# Altium schematic symbol library Regulator_Switching.SchLib: 1120 symbols (part 6 of 8) (continued)
## TMR_1-4823SM
designator *  value TMR_1-4823SM  Reference: U
ki_keywords: Murata isolated isolation dc-dc converter transformer; ki_description: +/-33mA Regulated 1W DC/DC converter with 1.5kV isolation, 36V-75V input, +/-15V fixed Output Voltage, SMD; ki_fp_filters: Converter*DCDC*TRACO*TMR-1SM*SMD*; Footprint: Converter_DCDC:Converter_DCDC_TRACO_TMR-1SM_SMD; Datasheet: http://assets.tracopower.com/TMR1SM/documents/tmr1sm-datasheet.pdf
pins: 1 -VIN, 2 Remote_on/off, 6 Common hidden, 7 -VOUT, 8 +VOUT, 9 Common, 14 +VIN

## TNY263G
designator *  value TNY263G  Reference: U
ki_keywords: Enhanced, Energy Efficient, Low Power Off-line Switcher; ki_description: TinySwitch-II Family, 4.7W Output Power, SMD-8B; ki_fp_filters: PowerIntegrations?SMD?8B*; Footprint: Package_DIP:PowerIntegrations_SMD-8B; Datasheet: http://www.powerint.com/sites/default/files/product-docs/tny263_268.pdf
pins: 1 BP, 2 S, 3 S hidden, 4 EN/UV, 5 D, 7 S hidden, 8 S hidden

## TNY263P
designator *  value TNY263P  Reference: U
ki_keywords: Enhanced, Energy Efficient, Low Power Off-line Switcher; ki_description: TinySwitch-II Family, 4.7W Output Power, DIP-8B; ki_fp_filters: PowerIntegrations?PDIP?8B*; Footprint: Package_DIP:PowerIntegrations_PDIP-8B; Datasheet: http://www.powerint.com/sites/default/files/product-docs/tny263_268.pdf
pins: 1 BP, 2 S, 3 S hidden, 4 EN/UV, 5 D, 7 S hidden, 8 S hidden

## TNY264G
designator *  value TNY264G  Reference: U
ki_keywords: Enhanced, Energy Efficient, Low Power Off-line Switcher; ki_description: TinySwitch-II Family, 6W Output Power, SMD-8B; ki_fp_filters: PowerIntegrations?SMD?8B*; Footprint: Package_DIP:PowerIntegrations_SMD-8B; Datasheet: http://www.powerint.com/sites/default/files/product-docs/tny263_268.pdf
pins: 1 BP, 2 S, 3 S hidden, 4 EN/UV, 5 D, 7 S hidden, 8 S hidden

## TNY264P
designator *  value TNY264P  Reference: U
ki_keywords: Enhanced, Energy Efficient, Low Power Off-line Switcher; ki_description: TinySwitch-II Family, 6W Output Power, DIP-8B; ki_fp_filters: PowerIntegrations?PDIP?8B*; Footprint: Package_DIP:PowerIntegrations_PDIP-8B; Datasheet: http://www.powerint.com/sites/default/files/product-docs/tny263_268.pdf
pins: 1 BP, 2 S, 3 S hidden, 4 EN/UV, 5 D, 7 S hidden, 8 S hidden

## TNY265G
designator *  value TNY265G  Reference: U
ki_keywords: Enhanced, Energy Efficient, Low Power Off-line Switcher; ki_description: TinySwitch-II Family, 7.5W Output Power, SMD-8B; ki_fp_filters: PowerIntegrations?SMD?8B*; Footprint: Package_DIP:PowerIntegrations_SMD-8B; Datasheet: http://www.powerint.com/sites/default/files/product-docs/tny263_268.pdf
pins: 1 BP, 2 S, 3 S hidden, 4 EN/UV, 5 D, 7 S hidden, 8 S hidden

## TNY265P
designator *  value TNY265P  Reference: U
ki_keywords: Enhanced, Energy Efficient, Low Power Off-line Switcher; ki_description: TinySwitch-II Family, 7.5W Output Power, DIP-8B; ki_fp_filters: PowerIntegrations?PDIP?8B*; Footprint: Package_DIP:PowerIntegrations_PDIP-8B; Datasheet: http://www.powerint.com/sites/default/files/product-docs/tny263_268.pdf
pins: 1 BP, 2 S, 3 S hidden, 4 EN/UV, 5 D, 7 S hidden, 8 S hidden

## TNY266G
designator *  value TNY266G  Reference: U
ki_keywords: Enhanced, Energy Efficient, Low Power Off-line Switcher; ki_description: TinySwitch-II Family, 9.5W Output Power, SMD-8B; ki_fp_filters: PowerIntegrations?SMD?8B*; Footprint: Package_DIP:PowerIntegrations_SMD-8B; Datasheet: http://www.powerint.com/sites/default/files/product-docs/tny263_268.pdf
pins: 1 BP, 2 S, 3 S hidden, 4 EN/UV, 5 D, 7 S hidden, 8 S hidden

## TNY266P
designator *  value TNY266P  Reference: U
ki_keywords: Enhanced, Energy Efficient, Low Power Off-line Switcher; ki_description: TinySwitch-II Family, 9.5W Output Power, DIP-8B; ki_fp_filters: PowerIntegrations?PDIP?8B*; Footprint: Package_DIP:PowerIntegrations_PDIP-8B; Datasheet: http://www.powerint.com/sites/default/files/product-docs/tny263_268.pdf
pins: 1 BP, 2 S, 3 S hidden, 4 EN/UV, 5 D, 7 S hidden, 8 S hidden

## TNY267G
designator *  value TNY267G  Reference: U
ki_keywords: Enhanced, Energy Efficient, Low Power Off-line Switcher; ki_description: TinySwitch-II Family, 12W Output Power, SMD-8B; ki_fp_filters: PowerIntegrations?SMD?8B*; Footprint: Package_DIP:PowerIntegrations_SMD-8B; Datasheet: http://www.powerint.com/sites/default/files/product-docs/tny263_268.pdf
pins: 1 BP, 2 S, 3 S hidden, 4 EN/UV, 5 D, 7 S hidden, 8 S hidden

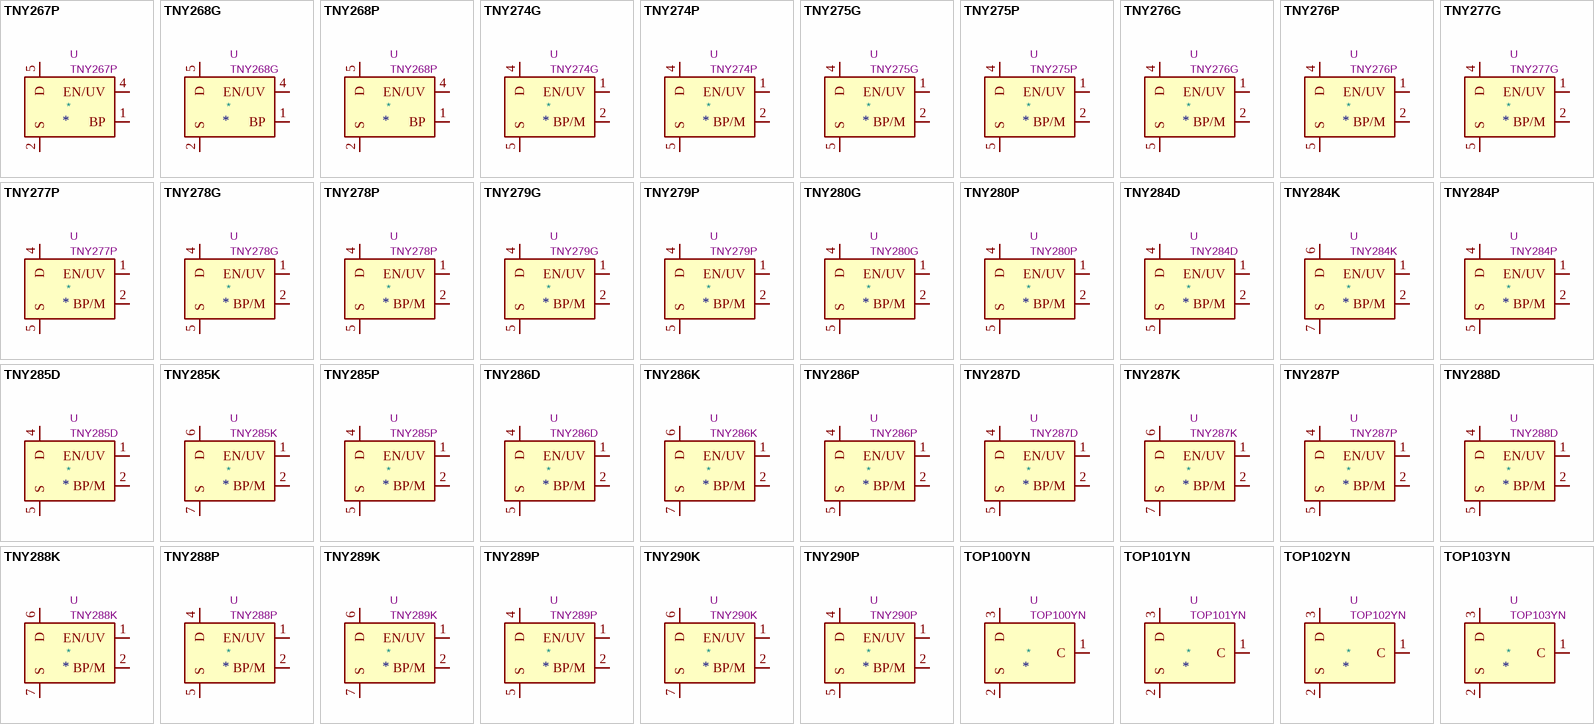
[diagram p21: symbols TNY267P to TOP103YN]

## TNY267P
designator *  value TNY267P  Reference: U
ki_keywords: Enhanced, Energy Efficient, Low Power Off-line Switcher; ki_description: TinySwitch-II Family, 12W Output Power, DIP-8B; ki_fp_filters: PowerIntegrations?PDIP?8B*; Footprint: Package_DIP:PowerIntegrations_PDIP-8B; Datasheet: http://www.powerint.com/sites/default/files/product-docs/tny263_268.pdf
pins: 1 BP, 2 S, 3 S hidden, 4 EN/UV, 5 D, 7 S hidden, 8 S hidden

## TNY268G
designator *  value TNY268G  Reference: U
ki_keywords: Enhanced, Energy Efficient, Low Power Off-line Switcher; ki_description: TinySwitch-II Family, 15W Output Power, SMD-8B; ki_fp_filters: PowerIntegrations?SMD?8B*; Footprint: Package_DIP:PowerIntegrations_SMD-8B; Datasheet: http://www.powerint.com/sites/default/files/product-docs/tny263_268.pdf
pins: 1 BP, 2 S, 3 S hidden, 4 EN/UV, 5 D, 7 S hidden, 8 S hidden

## TNY268P
designator *  value TNY268P  Reference: U
ki_keywords: Enhanced, Energy Efficient, Low Power Off-line Switcher; ki_description: TinySwitch-II Family, 15W Output Power, DIP-8B; ki_fp_filters: PowerIntegrations?PDIP?8B*; Footprint: Package_DIP:PowerIntegrations_PDIP-8B; Datasheet: http://www.powerint.com/sites/default/files/product-docs/tny263_268.pdf
pins: 1 BP, 2 S, 3 S hidden, 4 EN/UV, 5 D, 7 S hidden, 8 S hidden

## TNY274G
designator *  value TNY274G  Reference: U
ki_keywords: Energy-Efficient, Off-Line Switcher With Enhanced Flexibility and Extended Power Range; ki_description: TinySwitch-III Family, 8.5W Output Power, SMD-8C; ki_fp_filters: PowerIntegrations?SMD?8C*; Footprint: Package_DIP:PowerIntegrations_SMD-8C; Datasheet: http://www.powerint.com/sites/default/files/product-docs/tny274-280.pdf
pins: 1 EN/UV, 2 BP/M, 4 D, 5 S, 6 S hidden, 7 S hidden, 8 S hidden

## TNY274P
designator *  value TNY274P  Reference: U
ki_keywords: Energy-Efficient, Off-Line Switcher With Enhanced Flexibility and Extended Power Range; ki_description: TinySwitch-III Family, 8.5W Output Power, DIP-8C; ki_fp_filters: PowerIntegrations?PDIP?8C*; Footprint: Package_DIP:PowerIntegrations_PDIP-8C; Datasheet: http://www.powerint.com/sites/default/files/product-docs/tny274-280.pdf
pins: 1 EN/UV, 2 BP/M, 4 D, 5 S, 6 S hidden, 7 S hidden, 8 S hidden

## TNY275G
designator *  value TNY275G  Reference: U
ki_keywords: Energy-Efficient, Off-Line Switcher With Enhanced Flexibility and Extended Power Range; ki_description: TinySwitch-III Family, 11.5W Output Power, SMD-8C; ki_fp_filters: PowerIntegrations?SMD?8C*; Footprint: Package_DIP:PowerIntegrations_SMD-8C; Datasheet: http://www.powerint.com/sites/default/files/product-docs/tny274-280.pdf
pins: 1 EN/UV, 2 BP/M, 4 D, 5 S, 6 S hidden, 7 S hidden, 8 S hidden

## TNY275P
designator *  value TNY275P  Reference: U
ki_keywords: Energy-Efficient, Off-Line Switcher With Enhanced Flexibility and Extended Power Range; ki_description: TinySwitch-III Family, 11.5W Output Power, DIP-8C; ki_fp_filters: PowerIntegrations?PDIP?8C*; Footprint: Package_DIP:PowerIntegrations_PDIP-8C; Datasheet: http://www.powerint.com/sites/default/files/product-docs/tny274-280.pdf
pins: 1 EN/UV, 2 BP/M, 4 D, 5 S, 6 S hidden, 7 S hidden, 8 S hidden

## TNY276G
designator *  value TNY276G  Reference: U
ki_keywords: Energy-Efficient, Off-Line Switcher With Enhanced Flexibility and Extended Power Range; ki_description: TinySwitch-III Family, 15W Output Power, SMD-8C; ki_fp_filters: PowerIntegrations?SMD?8C*; Footprint: Package_DIP:PowerIntegrations_SMD-8C; Datasheet: http://www.powerint.com/sites/default/files/product-docs/tny274-280.pdf
pins: 1 EN/UV, 2 BP/M, 4 D, 5 S, 6 S hidden, 7 S hidden, 8 S hidden

## TNY276P
designator *  value TNY276P  Reference: U
ki_keywords: Energy-Efficient, Off-Line Switcher With Enhanced Flexibility and Extended Power Range; ki_description: TinySwitch-III Family, 15W Output Power, DIP-8C; ki_fp_filters: PowerIntegrations?PDIP?8C*; Footprint: Package_DIP:PowerIntegrations_PDIP-8C; Datasheet: http://www.powerint.com/sites/default/files/product-docs/tny274-280.pdf
pins: 1 EN/UV, 2 BP/M, 4 D, 5 S, 6 S hidden, 7 S hidden, 8 S hidden

## TNY277G
designator *  value TNY277G  Reference: U
ki_keywords: Energy-Efficient, Off-Line Switcher With Enhanced Flexibility and Extended Power Range; ki_description: TinySwitch-III Family, 18W Output Power, SMD-8C; ki_fp_filters: PowerIntegrations?SMD?8C*; Footprint: Package_DIP:PowerIntegrations_SMD-8C; Datasheet: http://www.powerint.com/sites/default/files/product-docs/tny274-280.pdf
pins: 1 EN/UV, 2 BP/M, 4 D, 5 S, 6 S hidden, 7 S hidden, 8 S hidden

## TNY277P
designator *  value TNY277P  Reference: U
ki_keywords: Energy-Efficient, Off-Line Switcher With Enhanced Flexibility and Extended Power Range; ki_description: TinySwitch-III Family, 18W Output Power, DIP-8C; ki_fp_filters: PowerIntegrations?PDIP?8C*; Footprint: Package_DIP:PowerIntegrations_PDIP-8C; Datasheet: http://www.powerint.com/sites/default/files/product-docs/tny274-280.pdf
pins: 1 EN/UV, 2 BP/M, 4 D, 5 S, 6 S hidden, 7 S hidden, 8 S hidden

## TNY278G
designator *  value TNY278G  Reference: U
ki_keywords: Energy-Efficient, Off-Line Switcher With Enhanced Flexibility and Extended Power Range; ki_description: TinySwitch-III Family, 21.5W Output Power, SMD-8C; ki_fp_filters: PowerIntegrations?SMD?8C*; Footprint: Package_DIP:PowerIntegrations_SMD-8C; Datasheet: http://www.powerint.com/sites/default/files/product-docs/tny274-280.pdf
pins: 1 EN/UV, 2 BP/M, 4 D, 5 S, 6 S hidden, 7 S hidden, 8 S hidden

## TNY278P
designator *  value TNY278P  Reference: U
ki_keywords: Energy-Efficient, Off-Line Switcher With Enhanced Flexibility and Extended Power Range; ki_description: TinySwitch-III Family, 21.5W Output Power, DIP-8C; ki_fp_filters: PowerIntegrations?PDIP?8C*; Footprint: Package_DIP:PowerIntegrations_PDIP-8C; Datasheet: http://www.powerint.com/sites/default/files/product-docs/tny274-280.pdf
pins: 1 EN/UV, 2 BP/M, 4 D, 5 S, 6 S hidden, 7 S hidden, 8 S hidden

## TNY279G
designator *  value TNY279G  Reference: U
ki_keywords: Energy-Efficient, Off-Line Switcher With Enhanced Flexibility and Extended Power Range; ki_description: TinySwitch-III Family, 25W Output Power, SMD-8C; ki_fp_filters: PowerIntegrations?SMD?8C*; Footprint: Package_DIP:PowerIntegrations_SMD-8C; Datasheet: http://www.powerint.com/sites/default/files/product-docs/tny274-280.pdf
pins: 1 EN/UV, 2 BP/M, 4 D, 5 S, 6 S hidden, 7 S hidden, 8 S hidden

## TNY279P
designator *  value TNY279P  Reference: U
ki_keywords: Energy-Efficient, Off-Line Switcher With Enhanced Flexibility and Extended Power Range; ki_description: TinySwitch-III Family, 25W Output Power, DIP-8C; ki_fp_filters: PowerIntegrations?PDIP?8C*; Footprint: Package_DIP:PowerIntegrations_PDIP-8C; Datasheet: http://www.powerint.com/sites/default/files/product-docs/tny274-280.pdf
pins: 1 EN/UV, 2 BP/M, 4 D, 5 S, 6 S hidden, 7 S hidden, 8 S hidden

## TNY280G
designator *  value TNY280G  Reference: U
ki_keywords: Energy-Efficient, Off-Line Switcher With Enhanced Flexibility and Extended Power Range; ki_description: TinySwitch-III Family, 28.5W Output Power, SMD-8C; ki_fp_filters: PowerIntegrations?SMD?8C*; Footprint: Package_DIP:PowerIntegrations_SMD-8C; Datasheet: http://www.powerint.com/sites/default/files/product-docs/tny274-280.pdf
pins: 1 EN/UV, 2 BP/M, 4 D, 5 S, 6 S hidden, 7 S hidden, 8 S hidden

## TNY280P
designator *  value TNY280P  Reference: U
ki_keywords: Energy-Efficient, Off-Line Switcher With Enhanced Flexibility and Extended Power Range; ki_description: TinySwitch-III Family, 28.5W Output Power, DIP-8C; ki_fp_filters: PowerIntegrations?PDIP?8C*; Footprint: Package_DIP:PowerIntegrations_PDIP-8C; Datasheet: http://www.powerint.com/sites/default/files/product-docs/tny274-280.pdf
pins: 1 EN/UV, 2 BP/M, 4 D, 5 S, 6 S hidden, 7 S hidden, 8 S hidden

## TNY284D
designator *  value TNY284D  Reference: U
ki_keywords: Energy-Efficient, Off-Line Switcher With Line Compensated Overload Power; ki_description: TinySwitch-4 Family, 8.5W Output Power, SO-8C; ki_fp_filters: PowerIntegrations?SO?8C*; Footprint: Package_SO:PowerIntegrations_SO-8C; Datasheet: https://ac-dc.power.com/sites/default/files/product-docs/tinyswitch-4_family_datasheet.pdf
pins: 1 EN/UV, 2 BP/M, 4 D, 5 S, 6 S hidden, 7 S hidden, 8 S hidden

## TNY284K
designator *  value TNY284K  Reference: U
ki_keywords: Energy-Efficient, Off-Line Switcher With Line Compensated Overload Power; ki_description: TinySwitch-4 Family, 8.5W Output Power, eSOP-12B; ki_fp_filters: PowerIntegrations?eSOP?12B*; Footprint: Package_SO:PowerIntegrations_eSOP-12B; Datasheet: https://ac-dc.power.com/sites/default/files/product-docs/tinyswitch-4_family_datasheet.pdf
pins: 1 EN/UV, 2 BP/M, 3 NC hidden, 4 NC hidden, 6 D, 7 S, 8 S hidden, 9 S hidden, 10 S hidden, 11 S hidden, 12 S hidden, 13 S hidden

## TNY284P
designator *  value TNY284P  Reference: U
ki_keywords: Energy-Efficient, Off-Line Switcher With Line Compensated Overload Power; ki_description: TinySwitch-4 Family, 8.5W Output Power, PDIP-8C; ki_fp_filters: PowerIntegrations?PDIP?8C*; Footprint: Package_DIP:PowerIntegrations_PDIP-8C; Datasheet: https://ac-dc.power.com/sites/default/files/product-docs/tinyswitch-4_family_datasheet.pdf
pins: 1 EN/UV, 2 BP/M, 4 D, 5 S, 6 S hidden, 7 S hidden, 8 S hidden

## TNY285D
designator *  value TNY285D  Reference: U
ki_keywords: Energy-Efficient, Off-Line Switcher With Line Compensated Overload Power; ki_description: TinySwitch-4 Family, 11.5W Output Power, SO-8C; ki_fp_filters: PowerIntegrations?SO?8C*; Footprint: Package_SO:PowerIntegrations_SO-8C; Datasheet: https://ac-dc.power.com/sites/default/files/product-docs/tinyswitch-4_family_datasheet.pdf
pins: 1 EN/UV, 2 BP/M, 4 D, 5 S, 6 S hidden, 7 S hidden, 8 S hidden

## TNY285K
designator *  value TNY285K  Reference: U
ki_keywords: Energy-Efficient, Off-Line Switcher With Line Compensated Overload Power; ki_description: TinySwitch-4 Family, 11.5W Output Power, eSOP-12B; ki_fp_filters: PowerIntegrations?eSOP?12B*; Footprint: Package_SO:PowerIntegrations_eSOP-12B; Datasheet: https://ac-dc.power.com/sites/default/files/product-docs/tinyswitch-4_family_datasheet.pdf
pins: 1 EN/UV, 2 BP/M, 3 NC hidden, 4 NC hidden, 6 D, 7 S, 8 S hidden, 9 S hidden, 10 S hidden, 11 S hidden, 12 S hidden, 13 S hidden

## TNY285P
designator *  value TNY285P  Reference: U
ki_keywords: Energy-Efficient, Off-Line Switcher With Line Compensated Overload Power; ki_description: TinySwitch-4 Family, 11.5W Output Power, PDIP-8C; ki_fp_filters: PowerIntegrations?PDIP?8C*; Footprint: Package_DIP:PowerIntegrations_PDIP-8C; Datasheet: https://ac-dc.power.com/sites/default/files/product-docs/tinyswitch-4_family_datasheet.pdf
pins: 1 EN/UV, 2 BP/M, 4 D, 5 S, 6 S hidden, 7 S hidden, 8 S hidden

## TNY286D
designator *  value TNY286D  Reference: U
ki_keywords: Energy-Efficient, Off-Line Switcher With Line Compensated Overload Power; ki_description: TinySwitch-4 Family, 15W Output Power, SO-8C; ki_fp_filters: PowerIntegrations?SO?8C*; Footprint: Package_SO:PowerIntegrations_SO-8C; Datasheet: https://ac-dc.power.com/sites/default/files/product-docs/tinyswitch-4_family_datasheet.pdf
pins: 1 EN/UV, 2 BP/M, 4 D, 5 S, 6 S hidden, 7 S hidden, 8 S hidden

## TNY286K
designator *  value TNY286K  Reference: U
ki_keywords: Energy-Efficient, Off-Line Switcher With Line Compensated Overload Power; ki_description: TinySwitch-4 Family, 15W Output Power, eSOP-12B; ki_fp_filters: PowerIntegrations?eSOP?12B*; Footprint: Package_SO:PowerIntegrations_eSOP-12B; Datasheet: https://ac-dc.power.com/sites/default/files/product-docs/tinyswitch-4_family_datasheet.pdf
pins: 1 EN/UV, 2 BP/M, 3 NC hidden, 4 NC hidden, 6 D, 7 S, 8 S hidden, 9 S hidden, 10 S hidden, 11 S hidden, 12 S hidden, 13 S hidden

## TNY286P
designator *  value TNY286P  Reference: U
ki_keywords: Energy-Efficient, Off-Line Switcher With Line Compensated Overload Power; ki_description: TinySwitch-4 Family, 15W Output Power, PDIP-8C; ki_fp_filters: PowerIntegrations?PDIP?8C*; Footprint: Package_DIP:PowerIntegrations_PDIP-8C; Datasheet: https://ac-dc.power.com/sites/default/files/product-docs/tinyswitch-4_family_datasheet.pdf
pins: 1 EN/UV, 2 BP/M, 4 D, 5 S, 6 S hidden, 7 S hidden, 8 S hidden

## TNY287D
designator *  value TNY287D  Reference: U
ki_keywords: Energy-Efficient, Off-Line Switcher With Line Compensated Overload Power; ki_description: TinySwitch-4 Family, 18W Output Power, SO-8C; ki_fp_filters: PowerIntegrations?SO?8C*; Footprint: Package_SO:PowerIntegrations_SO-8C; Datasheet: https://ac-dc.power.com/sites/default/files/product-docs/tinyswitch-4_family_datasheet.pdf
pins: 1 EN/UV, 2 BP/M, 4 D, 5 S, 6 S hidden, 7 S hidden, 8 S hidden

## TNY287K
designator *  value TNY287K  Reference: U
ki_keywords: Energy-Efficient, Off-Line Switcher With Line Compensated Overload Power; ki_description: TinySwitch-4 Family, 18W Output Power, eSOP-12B; ki_fp_filters: PowerIntegrations?eSOP?12B*; Footprint: Package_SO:PowerIntegrations_eSOP-12B; Datasheet: https://ac-dc.power.com/sites/default/files/product-docs/tinyswitch-4_family_datasheet.pdf
pins: 1 EN/UV, 2 BP/M, 3 NC hidden, 4 NC hidden, 6 D, 7 S, 8 S hidden, 9 S hidden, 10 S hidden, 11 S hidden, 12 S hidden, 13 S hidden

## TNY287P
designator *  value TNY287P  Reference: U
ki_keywords: Energy-Efficient, Off-Line Switcher With Line Compensated Overload Power; ki_description: TinySwitch-4 Family, 18W Output Power, PDIP-8C; ki_fp_filters: PowerIntegrations?PDIP?8C*; Footprint: Package_DIP:PowerIntegrations_PDIP-8C; Datasheet: https://ac-dc.power.com/sites/default/files/product-docs/tinyswitch-4_family_datasheet.pdf
pins: 1 EN/UV, 2 BP/M, 4 D, 5 S, 6 S hidden, 7 S hidden, 8 S hidden

## TNY288D
designator *  value TNY288D  Reference: U
ki_keywords: Energy-Efficient, Off-Line Switcher With Line Compensated Overload Power; ki_description: TinySwitch-4 Family, 19.5W Output Power, SO-8C; ki_fp_filters: PowerIntegrations?SO?8C*; Footprint: Package_SO:PowerIntegrations_SO-8C; Datasheet: https://ac-dc.power.com/sites/default/files/product-docs/tinyswitch-4_family_datasheet.pdf
pins: 1 EN/UV, 2 BP/M, 4 D, 5 S, 6 S hidden, 7 S hidden, 8 S hidden

## TNY288K
designator *  value TNY288K  Reference: U
ki_keywords: Energy-Efficient, Off-Line Switcher With Line Compensated Overload Power; ki_description: TinySwitch-4 Family, 21.5W Output Power, eSOP-12B; ki_fp_filters: PowerIntegrations?eSOP?12B*; Footprint: Package_SO:PowerIntegrations_eSOP-12B; Datasheet: https://ac-dc.power.com/sites/default/files/product-docs/tinyswitch-4_family_datasheet.pdf
pins: 1 EN/UV, 2 BP/M, 3 NC hidden, 4 NC hidden, 6 D, 7 S, 8 S hidden, 9 S hidden, 10 S hidden, 11 S hidden, 12 S hidden, 13 S hidden

## TNY288P
designator *  value TNY288P  Reference: U
ki_keywords: Energy-Efficient, Off-Line Switcher With Line Compensated Overload Power; ki_description: TinySwitch-4 Family, 21.5W Output Power, PDIP-8C; ki_fp_filters: PowerIntegrations?PDIP?8C*; Footprint: Package_DIP:PowerIntegrations_PDIP-8C; Datasheet: https://ac-dc.power.com/sites/default/files/product-docs/tinyswitch-4_family_datasheet.pdf
pins: 1 EN/UV, 2 BP/M, 4 D, 5 S, 6 S hidden, 7 S hidden, 8 S hidden

## TNY289K
designator *  value TNY289K  Reference: U
ki_keywords: Energy-Efficient, Off-Line Switcher With Line Compensated Overload Power; ki_description: TinySwitch-4 Family, 25W Output Power, eSOP-12B; ki_fp_filters: PowerIntegrations?eSOP?12B*; Footprint: Package_SO:PowerIntegrations_eSOP-12B; Datasheet: https://ac-dc.power.com/sites/default/files/product-docs/tinyswitch-4_family_datasheet.pdf
pins: 1 EN/UV, 2 BP/M, 3 NC hidden, 4 NC hidden, 6 D, 7 S, 8 S hidden, 9 S hidden, 10 S hidden, 11 S hidden, 12 S hidden, 13 S hidden

## TNY289P
designator *  value TNY289P  Reference: U
ki_keywords: Energy-Efficient, Off-Line Switcher With Line Compensated Overload Power; ki_description: TinySwitch-4 Family, 25W Output Power, PDIP-8C; ki_fp_filters: PowerIntegrations?PDIP?8C*; Footprint: Package_DIP:PowerIntegrations_PDIP-8C; Datasheet: https://ac-dc.power.com/sites/default/files/product-docs/tinyswitch-4_family_datasheet.pdf
pins: 1 EN/UV, 2 BP/M, 4 D, 5 S, 6 S hidden, 7 S hidden, 8 S hidden

## TNY290K
designator *  value TNY290K  Reference: U
ki_keywords: Energy-Efficient, Off-Line Switcher With Line Compensated Overload Power; ki_description: TinySwitch-4 Family, 28.5W Output Power, eSOP-12B; ki_fp_filters: PowerIntegrations?eSOP?12B*; Footprint: Package_SO:PowerIntegrations_eSOP-12B; Datasheet: https://ac-dc.power.com/sites/default/files/product-docs/tinyswitch-4_family_datasheet.pdf
pins: 1 EN/UV, 2 BP/M, 3 NC hidden, 4 NC hidden, 6 D, 7 S, 8 S hidden, 9 S hidden, 10 S hidden, 11 S hidden, 12 S hidden, 13 S hidden

## TNY290P
designator *  value TNY290P  Reference: U
ki_keywords: Energy-Efficient, Off-Line Switcher With Line Compensated Overload Power; ki_description: TinySwitch-4 Family, 28.5W Output Power, PDIP-8C; ki_fp_filters: PowerIntegrations?PDIP?8C*; Footprint: Package_DIP:PowerIntegrations_PDIP-8C; Datasheet: https://ac-dc.power.com/sites/default/files/product-docs/tinyswitch-4_family_datasheet.pdf
pins: 1 EN/UV, 2 BP/M, 4 D, 5 S, 6 S hidden, 7 S hidden, 8 S hidden

## TOP100YN
designator *  value TOP100YN  Reference: U
ki_keywords: Three-terminal Off-line PWM Switch; ki_description: TOPSwitch Family, 20W Max Output Power, TO-220; ki_fp_filters: TO?220*; Footprint: Package_TO_SOT_THT:TO-220-3_Vertical; Datasheet: http://www.powerint.com/sites/default/files/product-docs/top100.pdf
pins: 1 C, 2 S, 3 D

## TOP101YN
designator *  value TOP101YN  Reference: U
ki_keywords: Three-terminal Off-line PWM Switch; ki_description: TOPSwitch Family, 35W Max Output Power, TO-220; ki_fp_filters: TO?220*; Footprint: Package_TO_SOT_THT:TO-220-3_Vertical; Datasheet: http://www.powerint.com/sites/default/files/product-docs/top100.pdf
pins: 1 C, 2 S, 3 D

## TOP102YN
designator *  value TOP102YN  Reference: U
ki_keywords: Three-terminal Off-line PWM Switch; ki_description: TOPSwitch Family, 45W Max Output Power, TO-220; ki_fp_filters: TO?220*; Footprint: Package_TO_SOT_THT:TO-220-3_Vertical; Datasheet: http://www.powerint.com/sites/default/files/product-docs/top100.pdf
pins: 1 C, 2 S, 3 D

## TOP103YN
designator *  value TOP103YN  Reference: U
ki_keywords: Three-terminal Off-line PWM Switch; ki_description: TOPSwitch Family, 55W Max Output Power, TO-220; ki_fp_filters: TO?220*; Footprint: Package_TO_SOT_THT:TO-220-3_Vertical; Datasheet: http://www.powerint.com/sites/default/files/product-docs/top100.pdf
pins: 1 C, 2 S, 3 D

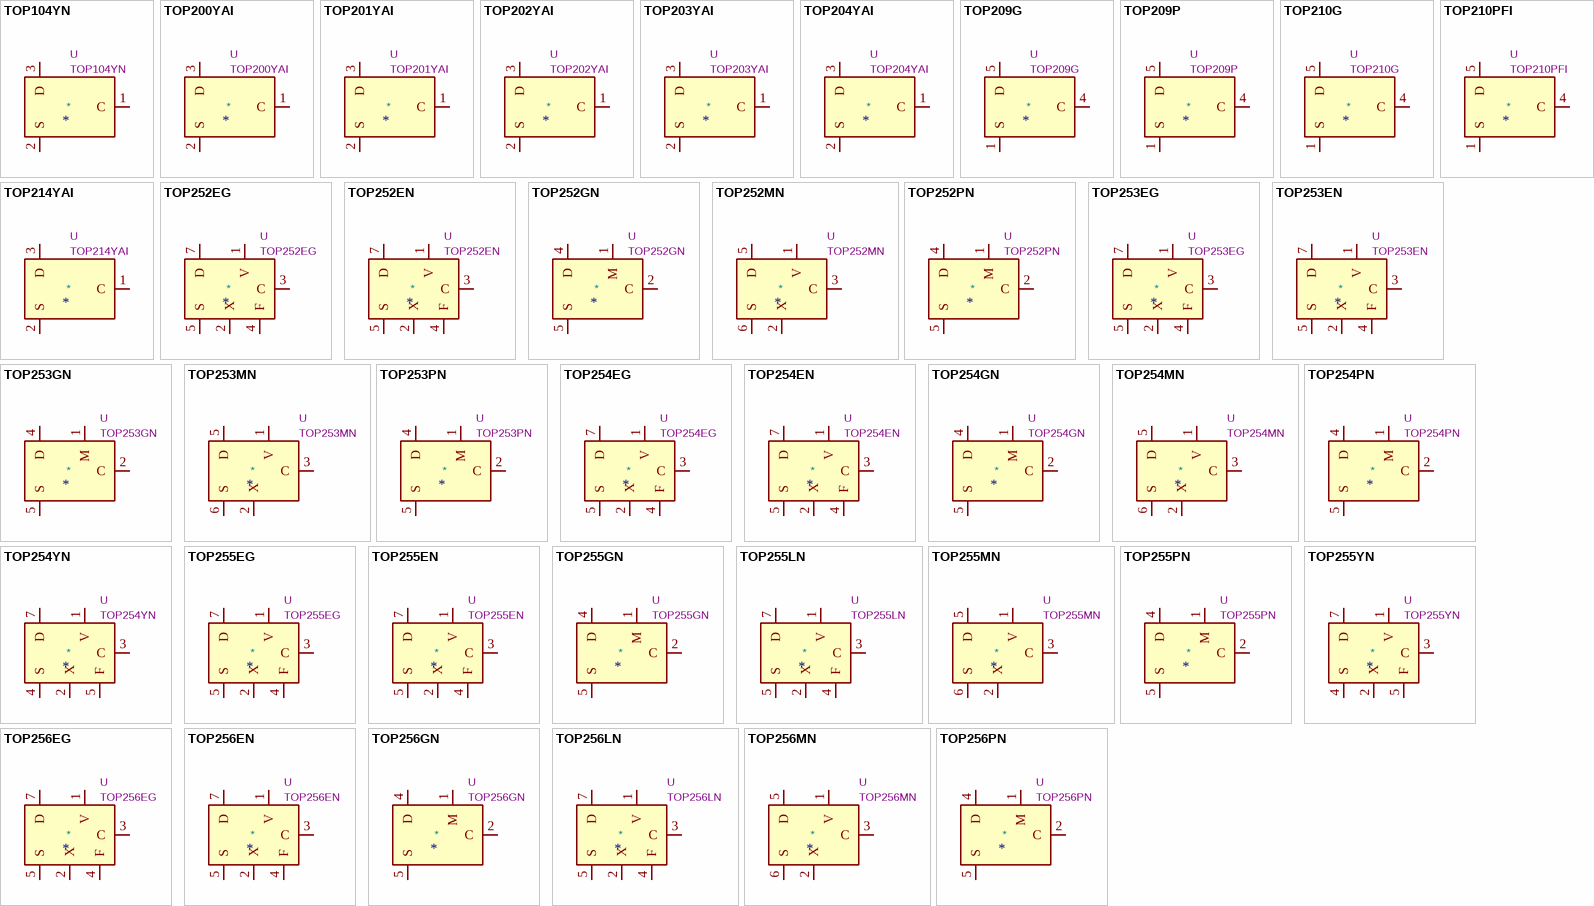
[diagram p22: symbols TOP104YN to TOP256PN]

## TOP104YN
designator *  value TOP104YN  Reference: U
ki_keywords: Three-terminal Off-line PWM Switch; ki_description: TOPSwitch Family, 60W Max Output Power, TO-220; ki_fp_filters: TO?220*; Footprint: Package_TO_SOT_THT:TO-220-3_Vertical; Datasheet: http://www.powerint.com/sites/default/files/product-docs/top100.pdf
pins: 1 C, 2 S, 3 D

## TOP200YAI
designator *  value TOP200YAI  Reference: U
ki_keywords: Three-terminal Off-line PWM Switch; ki_description: TOPSwitch Family, 12W Max Output Power, TO-220; ki_fp_filters: TO?220*; Footprint: Package_TO_SOT_THT:TO-220-3_Vertical; Datasheet: http://www.powerint.com/sites/default/files/product-docs/top200-204214.pdf
pins: 1 C, 2 S, 3 D

## TOP201YAI
designator *  value TOP201YAI  Reference: U
ki_keywords: Three-terminal Off-line PWM Switch; ki_description: TOPSwitch Family, 22W Max Output Power, TO-220; ki_fp_filters: TO?220*; Footprint: Package_TO_SOT_THT:TO-220-3_Vertical; Datasheet: http://www.powerint.com/sites/default/files/product-docs/top200-204214.pdf
pins: 1 C, 2 S, 3 D

## TOP202YAI
designator *  value TOP202YAI  Reference: U
ki_keywords: Three-terminal Off-line PWM Switch; ki_description: TOPSwitch Family, 30W Max Output Power, TO-220; ki_fp_filters: TO?220*; Footprint: Package_TO_SOT_THT:TO-220-3_Vertical; Datasheet: http://www.powerint.com/sites/default/files/product-docs/top200-204214.pdf
pins: 1 C, 2 S, 3 D

## TOP203YAI
designator *  value TOP203YAI  Reference: U
ki_keywords: Three-terminal Off-line PWM Switch; ki_description: TOPSwitch Family, 35W Max Output Power, TO-220; ki_fp_filters: TO?220*; Footprint: Package_TO_SOT_THT:TO-220-3_Vertical; Datasheet: http://www.powerint.com/sites/default/files/product-docs/top200-204214.pdf
pins: 1 C, 2 S, 3 D

## TOP204YAI
designator *  value TOP204YAI  Reference: U
ki_keywords: Three-terminal Off-line PWM Switch; ki_description: TOPSwitch Family, 50W Max Output Power, TO-220; ki_fp_filters: TO?220*; Footprint: Package_TO_SOT_THT:TO-220-3_Vertical; Datasheet: http://www.powerint.com/sites/default/files/product-docs/top200-204214.pdf
pins: 1 C, 2 S, 3 D

## TOP209G
designator *  value TOP209G  Reference: U
ki_keywords: Three-terminal Off-line PWM Switch; ki_description: TOPSwitch Family, 2W Max Output Power, SMD-8; ki_fp_filters: PowerIntegrations?SMD?8*; Footprint: Package_DIP:PowerIntegrations_SMD-8; Datasheet: http://www.powerint.com/sites/default/files/product-docs/top209210.pdf
pins: 1 S, 2 NC hidden, 3 NC hidden, 4 C, 5 D, 6 NC hidden, 7 NC hidden, 8 S hidden

## TOP209P
designator *  value TOP209P  Reference: U
ki_keywords: Three-terminal Off-line PWM Switch; ki_description: TOPSwitch Family, 2W Max Output Power, DIP-8; ki_fp_filters: DIP*W7.62mm*; Footprint: Package_DIP:DIP-8_W7.62mm; Datasheet: http://www.powerint.com/sites/default/files/product-docs/top209210.pdf
pins: 1 S, 2 NC hidden, 3 NC hidden, 4 C, 5 D, 6 NC hidden, 7 NC hidden, 8 S hidden

## TOP210G
designator *  value TOP210G  Reference: U
ki_keywords: Three-terminal Off-line PWM Switch; ki_description: TOPSwitch Family, 5W Max Output Power, SMD-8; ki_fp_filters: PowerIntegrations?SMD?8*; Footprint: Package_DIP:PowerIntegrations_SMD-8; Datasheet: http://www.powerint.com/sites/default/files/product-docs/top209210.pdf
pins: 1 S, 2 NC hidden, 3 NC hidden, 4 C, 5 D, 6 NC hidden, 7 NC hidden, 8 S hidden

## TOP210PFI
designator *  value TOP210PFI  Reference: U
ki_keywords: Three-terminal Off-line PWM Switch; ki_description: TOPSwitch Family, 5W Max Output Power, DIP-8; ki_fp_filters: DIP*W7.62mm*; Footprint: Package_DIP:DIP-8_W7.62mm; Datasheet: http://www.powerint.com/sites/default/files/product-docs/top209210.pdf
pins: 1 S, 2 NC hidden, 3 NC hidden, 4 C, 5 D, 6 NC hidden, 7 NC hidden, 8 S hidden

## TOP214YAI
designator *  value TOP214YAI  Reference: U
ki_keywords: Three-terminal Off-line PWM Switch; ki_description: TOPSwitch Family, 42W Max Output Power, TO-220; ki_fp_filters: TO?220*; Footprint: Package_TO_SOT_THT:TO-220-3_Vertical; Datasheet: http://www.powerint.com/sites/default/files/product-docs/top200-204214.pdf
pins: 1 C, 2 S, 3 D

## TOP252EG
designator *  value TOP252EG  Reference: U
ki_keywords: Eco Smart Off-Line Switcher, Extendend Power Range; ki_description: TOPSwitch-HX Family, 13W Output Power; ki_fp_filters: PowerIntegrations?eSIP?7C*; Footprint: Package_SIP:PowerIntegrations_eSIP-7C; Datasheet: https://ac-dc.power.com/sites/default/files/product-docs/topswitch-hx_family_datasheet.pdf
pins: 1 V, 2 X, 3 C, 4 F, 5 S, 7 D

## TOP252EN
designator *  value TOP252EN  Reference: U
ki_keywords: Eco Smart Off-Line Switcher, Extendend Power Range; ki_description: TOPSwitch-HX Family, 13W Output Power; ki_fp_filters: PowerIntegrations?eSIP?7C*; Footprint: Package_SIP:PowerIntegrations_eSIP-7C; Datasheet: https://ac-dc.power.com/sites/default/files/product-docs/topswitch-hx_family_datasheet.pdf
pins: 1 V, 2 X, 3 C, 4 F, 5 S, 7 D

## TOP252GN
designator *  value TOP252GN  Reference: U
ki_keywords: Eco Smart Off-Line Switcher, Extendend Power Range; ki_description: TOPSwitch-HX Family, 10W Output Power; ki_fp_filters: PowerIntegrations?SMD?8C*; Footprint: Package_DIP:PowerIntegrations_SMD-8C; Datasheet: https://ac-dc.power.com/sites/default/files/product-docs/topswitch-hx_family_datasheet.pdf
pins: 1 M, 2 C, 4 D, 5 S, 6 S hidden, 7 S hidden, 8 S hidden

## TOP252MN
designator *  value TOP252MN  Reference: U
ki_keywords: Eco Smart Off-Line Switcher, Extendend Power Range; ki_description: TOPSwitch-HX Family, 10W Output Power; ki_fp_filters: PowerIntegrations?SDIP?10C*; Footprint: Package_DIP:PowerIntegrations_SDIP-10C; Datasheet: https://ac-dc.power.com/sites/default/files/product-docs/topswitch-hx_family_datasheet.pdf
pins: 1 V, 2 X, 3 C, 5 D, 6 S, 7 S hidden, 8 S hidden, 9 S hidden, 10 S hidden

## TOP252PN
designator *  value TOP252PN  Reference: U
ki_keywords: Eco Smart Off-Line Switcher, Extendend Power Range; ki_description: TOPSwitch-HX Family, 10W Output Power; ki_fp_filters: PowerIntegrations?PDIP?8C*; Footprint: Package_DIP:PowerIntegrations_PDIP-8C; Datasheet: https://ac-dc.power.com/sites/default/files/product-docs/topswitch-hx_family_datasheet.pdf
pins: 1 M, 2 C, 4 D, 5 S, 6 S hidden, 7 S hidden, 8 S hidden

## TOP253EG
designator *  value TOP253EG  Reference: U
ki_keywords: Eco Smart Off-Line Switcher, Extendend Power Range; ki_description: TOPSwitch-HX Family, 29W Output Power; ki_fp_filters: PowerIntegrations?eSIP?7C*; Footprint: Package_SIP:PowerIntegrations_eSIP-7C; Datasheet: https://ac-dc.power.com/sites/default/files/product-docs/topswitch-hx_family_datasheet.pdf
pins: 1 V, 2 X, 3 C, 4 F, 5 S, 7 D

## TOP253EN
designator *  value TOP253EN  Reference: U
ki_keywords: Eco Smart Off-Line Switcher, Extendend Power Range; ki_description: TOPSwitch-HX Family, 29W Output Power; ki_fp_filters: PowerIntegrations?eSIP?7C*; Footprint: Package_SIP:PowerIntegrations_eSIP-7C; Datasheet: https://ac-dc.power.com/sites/default/files/product-docs/topswitch-hx_family_datasheet.pdf
pins: 1 V, 2 X, 3 C, 4 F, 5 S, 7 D

## TOP253GN
designator *  value TOP253GN  Reference: U
ki_keywords: Eco Smart Off-Line Switcher, Extendend Power Range; ki_description: TOPSwitch-HX Family, 15W Output Power; ki_fp_filters: PowerIntegrations?SMD?8C*; Footprint: Package_DIP:PowerIntegrations_SMD-8C; Datasheet: https://ac-dc.power.com/sites/default/files/product-docs/topswitch-hx_family_datasheet.pdf
pins: 1 M, 2 C, 4 D, 5 S, 6 S hidden, 7 S hidden, 8 S hidden

## TOP253MN
designator *  value TOP253MN  Reference: U
ki_keywords: Eco Smart Off-Line Switcher, Extendend Power Range; ki_description: TOPSwitch-HX Family, 15W Output Power; ki_fp_filters: PowerIntegrations?SDIP?10C*; Footprint: Package_DIP:PowerIntegrations_SDIP-10C; Datasheet: https://ac-dc.power.com/sites/default/files/product-docs/topswitch-hx_family_datasheet.pdf
pins: 1 V, 2 X, 3 C, 5 D, 6 S, 7 S hidden, 8 S hidden, 9 S hidden, 10 S hidden

## TOP253PN
designator *  value TOP253PN  Reference: U
ki_keywords: Eco Smart Off-Line Switcher, Extendend Power Range; ki_description: TOPSwitch-HX Family, 15W Output Power; ki_fp_filters: PowerIntegrations?PDIP?8C*; Footprint: Package_DIP:PowerIntegrations_PDIP-8C; Datasheet: https://ac-dc.power.com/sites/default/files/product-docs/topswitch-hx_family_datasheet.pdf
pins: 1 M, 2 C, 4 D, 5 S, 6 S hidden, 7 S hidden, 8 S hidden

## TOP254EG
designator *  value TOP254EG  Reference: U
ki_keywords: Eco Smart Off-Line Switcher, Extendend Power Range; ki_description: TOPSwitch-HX Family, 43W Output Power; ki_fp_filters: PowerIntegrations?eSIP?7C*; Footprint: Package_SIP:PowerIntegrations_eSIP-7C; Datasheet: https://ac-dc.power.com/sites/default/files/product-docs/topswitch-hx_family_datasheet.pdf
pins: 1 V, 2 X, 3 C, 4 F, 5 S, 7 D

## TOP254EN
designator *  value TOP254EN  Reference: U
ki_keywords: Eco Smart Off-Line Switcher, Extendend Power Range; ki_description: TOPSwitch-HX Family, 43W Output Power; ki_fp_filters: PowerIntegrations?eSIP?7C*; Footprint: Package_SIP:PowerIntegrations_eSIP-7C; Datasheet: https://ac-dc.power.com/sites/default/files/product-docs/topswitch-hx_family_datasheet.pdf
pins: 1 V, 2 X, 3 C, 4 F, 5 S, 7 D

## TOP254GN
designator *  value TOP254GN  Reference: U
ki_keywords: Eco Smart Off-Line Switcher, Extendend Power Range; ki_description: TOPSwitch-HX Family, 20W Output Power; ki_fp_filters: PowerIntegrations?SMD?8C*; Footprint: Package_DIP:PowerIntegrations_SMD-8C; Datasheet: https://ac-dc.power.com/sites/default/files/product-docs/topswitch-hx_family_datasheet.pdf
pins: 1 M, 2 C, 4 D, 5 S, 6 S hidden, 7 S hidden, 8 S hidden

## TOP254MN
designator *  value TOP254MN  Reference: U
ki_keywords: Eco Smart Off-Line Switcher, Extendend Power Range; ki_description: TOPSwitch-HX Family, 20W Output Power; ki_fp_filters: PowerIntegrations?SDIP?10C*; Footprint: Package_DIP:PowerIntegrations_SDIP-10C; Datasheet: https://ac-dc.power.com/sites/default/files/product-docs/topswitch-hx_family_datasheet.pdf
pins: 1 V, 2 X, 3 C, 5 D, 6 S, 7 S hidden, 8 S hidden, 9 S hidden, 10 S hidden

## TOP254PN
designator *  value TOP254PN  Reference: U
ki_keywords: Eco Smart Off-Line Switcher, Extendend Power Range; ki_description: TOPSwitch-HX Family, 20W Output Power; ki_fp_filters: PowerIntegrations?PDIP?8C*; Footprint: Package_DIP:PowerIntegrations_PDIP-8C; Datasheet: https://ac-dc.power.com/sites/default/files/product-docs/topswitch-hx_family_datasheet.pdf
pins: 1 M, 2 C, 4 D, 5 S, 6 S hidden, 7 S hidden, 8 S hidden

## TOP254YN
designator *  value TOP254YN  Reference: U
ki_keywords: Eco Smart Off-Line Switcher, Extendend Power Range; ki_description: TOPSwitch-HX Family, 43W Output Power; ki_fp_filters: PowerIntegrations*TO?220?7C*; Footprint: Package_TO_SOT_THT:PowerIntegrations_TO-220-7C; Datasheet: https://ac-dc.power.com/sites/default/files/product-docs/topswitch-hx_family_datasheet.pdf
pins: 1 V, 2 X, 3 C, 4 S, 5 F, 7 D

## TOP255EG
designator *  value TOP255EG  Reference: U
ki_keywords: Eco Smart Off-Line Switcher, Extendend Power Range; ki_description: TOPSwitch-HX Family, 57W Output Power; ki_fp_filters: PowerIntegrations?eSIP?7C*; Footprint: Package_SIP:PowerIntegrations_eSIP-7C; Datasheet: https://ac-dc.power.com/sites/default/files/product-docs/topswitch-hx_family_datasheet.pdf
pins: 1 V, 2 X, 3 C, 4 F, 5 S, 7 D

## TOP255EN
designator *  value TOP255EN  Reference: U
ki_keywords: Eco Smart Off-Line Switcher, Extendend Power Range; ki_description: TOPSwitch-HX Family, 57W Output Power; ki_fp_filters: PowerIntegrations?eSIP?7C*; Footprint: Package_SIP:PowerIntegrations_eSIP-7C; Datasheet: https://ac-dc.power.com/sites/default/files/product-docs/topswitch-hx_family_datasheet.pdf
pins: 1 V, 2 X, 3 C, 4 F, 5 S, 7 D

## TOP255GN
designator *  value TOP255GN  Reference: U
ki_keywords: Eco Smart Off-Line Switcher, Extendend Power Range; ki_description: TOPSwitch-HX Family, 22W Output Power; ki_fp_filters: PowerIntegrations?SMD?8C*; Footprint: Package_DIP:PowerIntegrations_SMD-8C; Datasheet: https://ac-dc.power.com/sites/default/files/product-docs/topswitch-hx_family_datasheet.pdf
pins: 1 M, 2 C, 4 D, 5 S, 6 S hidden, 7 S hidden, 8 S hidden

## TOP255LN
designator *  value TOP255LN  Reference: U
ki_keywords: Eco Smart Off-Line Switcher, Extendend Power Range; ki_description: TOPSwitch-HX Family, 57W Output Power; ki_fp_filters: PowerIntegrations?eSIP?7F*; Footprint: Package_SIP:PowerIntegrations_eSIP-7F; Datasheet: https://ac-dc.power.com/sites/default/files/product-docs/topswitch-hx_family_datasheet.pdf
pins: 1 V, 2 X, 3 C, 4 F, 5 S, 7 D

## TOP255MN
designator *  value TOP255MN  Reference: U
ki_keywords: Eco Smart Off-Line Switcher, Extendend Power Range; ki_description: TOPSwitch-HX Family, 22W Output Power; ki_fp_filters: PowerIntegrations?SDIP?10C*; Footprint: Package_DIP:PowerIntegrations_SDIP-10C; Datasheet: https://ac-dc.power.com/sites/default/files/product-docs/topswitch-hx_family_datasheet.pdf
pins: 1 V, 2 X, 3 C, 5 D, 6 S, 7 S hidden, 8 S hidden, 9 S hidden, 10 S hidden

## TOP255PN
designator *  value TOP255PN  Reference: U
ki_keywords: Eco Smart Off-Line Switcher, Extendend Power Range; ki_description: TOPSwitch-HX Family, 22W Output Power; ki_fp_filters: PowerIntegrations?PDIP?8C*; Footprint: Package_DIP:PowerIntegrations_PDIP-8C; Datasheet: https://ac-dc.power.com/sites/default/files/product-docs/topswitch-hx_family_datasheet.pdf
pins: 1 M, 2 C, 4 D, 5 S, 6 S hidden, 7 S hidden, 8 S hidden

## TOP255YN
designator *  value TOP255YN  Reference: U
ki_keywords: Eco Smart Off-Line Switcher, Extendend Power Range; ki_description: TOPSwitch-HX Family, 57W Output Power; ki_fp_filters: PowerIntegrations*TO?220?7C*; Footprint: Package_TO_SOT_THT:PowerIntegrations_TO-220-7C; Datasheet: https://ac-dc.power.com/sites/default/files/product-docs/topswitch-hx_family_datasheet.pdf
pins: 1 V, 2 X, 3 C, 4 S, 5 F, 7 D

## TOP256EG
designator *  value TOP256EG  Reference: U
ki_keywords: Eco Smart Off-Line Switcher, Extendend Power Range; ki_description: TOPSwitch-HX Family, 86W Output Power; ki_fp_filters: PowerIntegrations?eSIP?7C*; Footprint: Package_SIP:PowerIntegrations_eSIP-7C; Datasheet: https://ac-dc.power.com/sites/default/files/product-docs/topswitch-hx_family_datasheet.pdf
pins: 1 V, 2 X, 3 C, 4 F, 5 S, 7 D

## TOP256EN
designator *  value TOP256EN  Reference: U
ki_keywords: Eco Smart Off-Line Switcher, Extendend Power Range; ki_description: TOPSwitch-HX Family, 86W Output Power; ki_fp_filters: PowerIntegrations?eSIP?7C*; Footprint: Package_SIP:PowerIntegrations_eSIP-7C; Datasheet: https://ac-dc.power.com/sites/default/files/product-docs/topswitch-hx_family_datasheet.pdf
pins: 1 V, 2 X, 3 C, 4 F, 5 S, 7 D

## TOP256GN
designator *  value TOP256GN  Reference: U
ki_keywords: Eco Smart Off-Line Switcher, Extendend Power Range; ki_description: TOPSwitch-HX Family, 26W Output Power; ki_fp_filters: PowerIntegrations?SMD?8C*; Footprint: Package_DIP:PowerIntegrations_SMD-8C; Datasheet: https://ac-dc.power.com/sites/default/files/product-docs/topswitch-hx_family_datasheet.pdf
pins: 1 M, 2 C, 4 D, 5 S, 6 S hidden, 7 S hidden, 8 S hidden

## TOP256LN
designator *  value TOP256LN  Reference: U
ki_keywords: Eco Smart Off-Line Switcher, Extendend Power Range; ki_description: TOPSwitch-HX Family, 64W Output Power; ki_fp_filters: PowerIntegrations?eSIP?7F*; Footprint: Package_SIP:PowerIntegrations_eSIP-7F; Datasheet: https://ac-dc.power.com/sites/default/files/product-docs/topswitch-hx_family_datasheet.pdf
pins: 1 V, 2 X, 3 C, 4 F, 5 S, 7 D

## TOP256MN
designator *  value TOP256MN  Reference: U
ki_keywords: Eco Smart Off-Line Switcher, Extendend Power Range; ki_description: TOPSwitch-HX Family, 26W Output Power; ki_fp_filters: PowerIntegrations?SDIP?10C*; Footprint: Package_DIP:PowerIntegrations_SDIP-10C; Datasheet: https://ac-dc.power.com/sites/default/files/product-docs/topswitch-hx_family_datasheet.pdf
pins: 1 V, 2 X, 3 C, 5 D, 6 S, 7 S hidden, 8 S hidden, 9 S hidden, 10 S hidden

## TOP256PN
designator *  value TOP256PN  Reference: U
ki_keywords: Eco Smart Off-Line Switcher, Extendend Power Range; ki_description: TOPSwitch-HX Family, 26W Output Power; ki_fp_filters: PowerIntegrations?PDIP?8C*; Footprint: Package_DIP:PowerIntegrations_PDIP-8C; Datasheet: https://ac-dc.power.com/sites/default/files/product-docs/topswitch-hx_family_datasheet.pdf
pins: 1 M, 2 C, 4 D, 5 S, 6 S hidden, 7 S hidden, 8 S hidden

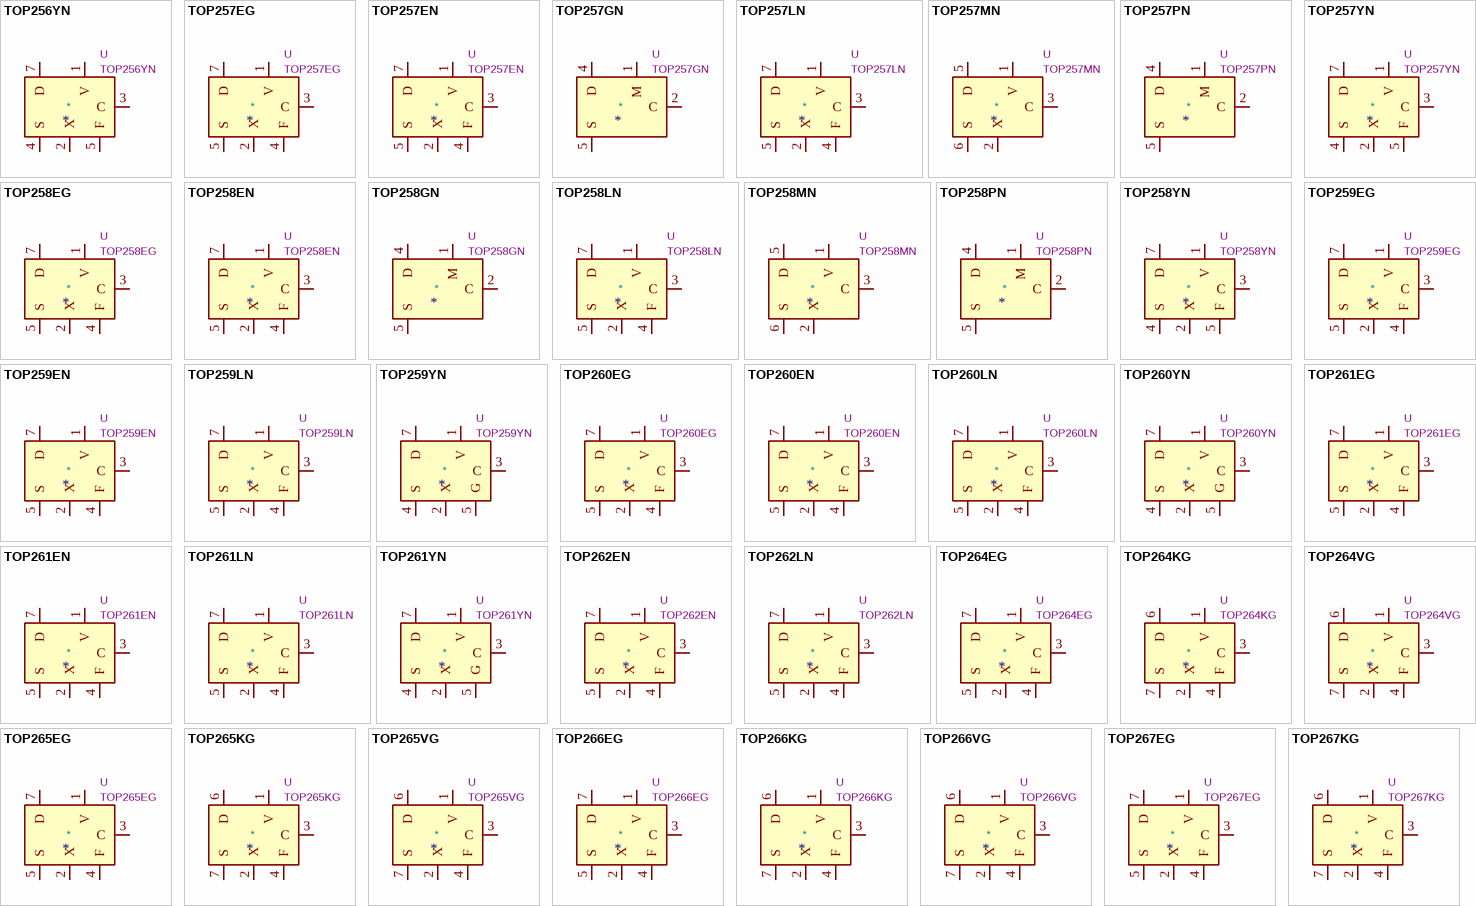
[diagram p23: symbols TOP256YN to TOP267KG]